# Altium footprint library UWRT Footprint Library.PcbLib: 258 footprints (part 14 of 17)
Each footprint in its own frame and in the unit in brackets; x right, y up, seen from the top. Pads: shape width x height; smd on the part's side, far side on the other; paste and mask are expansions set on the pad; w line width, h text height; cw(c..) or ccw(c..) is an arc to the next point about the centre after c.
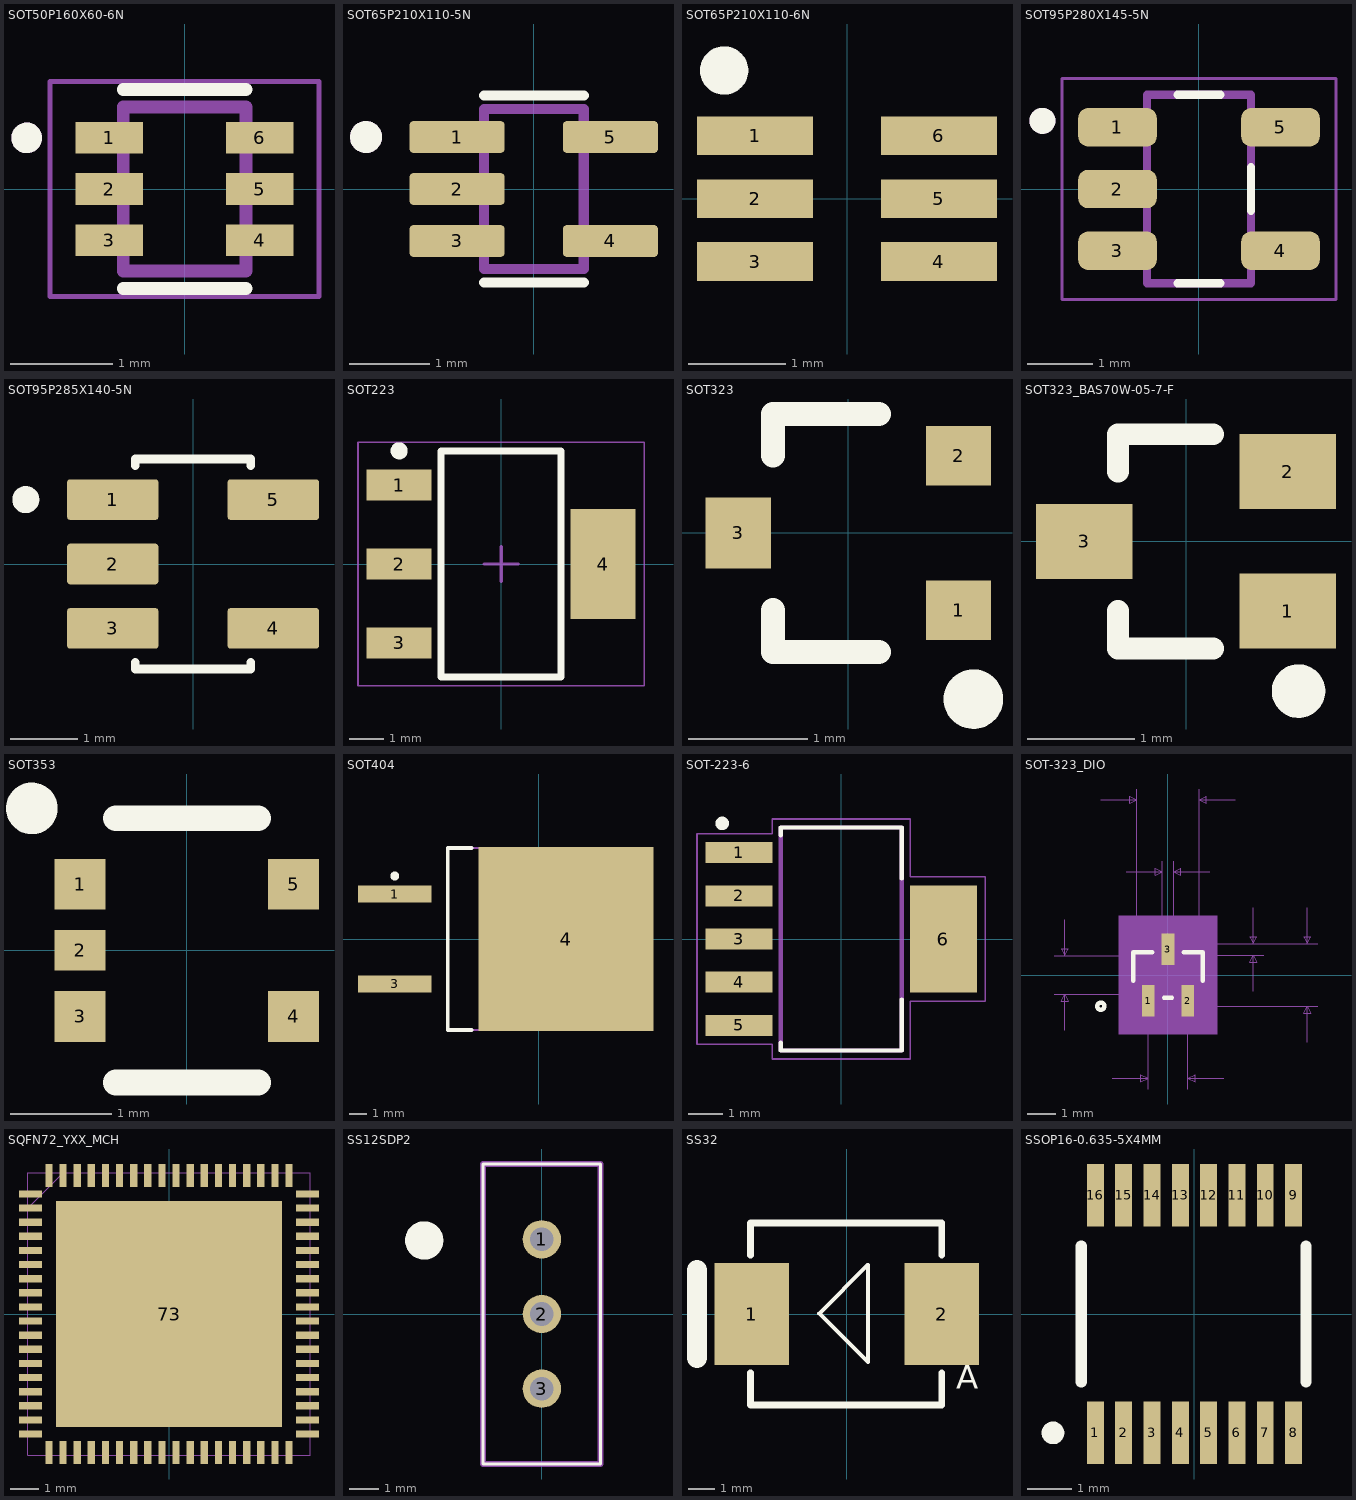
[diagram p13: the footprints below, top view; thin cyan lines are the x and y axes]

## SOT50P160X60-6N [mm]
pads (6):
  rect 0.66x0.31 smd: 1(-0.735,0.5) 2(-0.735,0) 3(-0.735,-0.5) 4(0.735,-0.5) 5(0.735,0) 6(0.735,0.5)
Top Overlay:
  circle w0.15: c-1.545,0.5 r0.075
  lines w0.127: -0.6,-0.975 0.6,-0.975 ; -0.6,0.975 0.6,0.975
Mechanical 4:
  circle w0.15: c-1.545,0.5 r0.075
  circle w0.15: c-1.545,0.5 r0.075
  lines w0.127: -0.6,-0.8 0.6,-0.8 ; -0.6,-0.8 -0.6,0.8 ; -0.6,-0.8 0.6,-0.8 ; -0.6,-0.8 -0.6,0.8 ; -0.6,0.8 0.6,0.8 ; -0.6,0.8 0.6,0.8 ; 0.6,-0.8 0.6,0.8 ; 0.6,-0.8 0.6,0.8
Mechanical 16:
  lines w0.05: -1.315,-1.05 1.315,-1.05 1.315,1.05 -1.315,1.05 -1.315,-1.05
3D body "DRL0006A.stp": height 0.6, standoff 0, extent -0.8,-0.8 0.8,0.8

## SOT65P210X110-5N [mm]
pads (5):
  rrect25% 1.19x0.4 smd: 1(-0.96,0.65) 2(-0.96,0) 3(-0.96,-0.65) 4(0.96,-0.65) 5(0.96,0.65)
Top Overlay:
  circle w0.2: c-2.1,0.65 r0.1
  lines w0.127: -0.625,-1.17 0.625,-1.17 ; -0.625,1.17 0.625,1.17
Mechanical 13:
  circle w0.2: c-2.1,0.65 r0.1
  lines w0.127: -0.625,-1 -0.625,1 0.625,1 0.625,-1 -0.625,-1
3D body "step_temp.STEP": height 1.1, standoff 0, extent -1.05,-1 1.05,1

## SOT65P210X110-6N [mm]
pads (6):
  rect 1.2x0.4 smd: 1(-0.95,0.65) 2(-0.95,0) 3(-0.95,-0.65) 4(0.95,-0.65) 5(0.95,0) 6(0.95,0.65)
Top Overlay:
  circle w0.25: c-1.27,1.325 r0.125
3D body "SN74LVC1T45QDCKRQ1.stp": height 1.1, standoff 0, extent -1.05,-1 1.05,1

## SOT95P280X145-5N [mm]
pads (5):
  rrect50% 1.21x0.59 smd: 1(-1.255,0.95) 2(-1.255,0) 3(-1.255,-0.95) 4(1.255,-0.95) 5(1.255,0.95)
Top Overlay:
  circle w0.2: c-2.41,1.05 r0.1
  lines w0.127: -0.33,-1.45 0.33,-1.45 ; -0.33,1.45 0.33,1.45 ; 0.8,-0.335 0.8,0.335
Mechanical 13:
  circle w0.2: c-2.41,1.05 r0.1
  lines w0.127: -0.8,-1.45 0.8,-1.45 0.8,1.45 -0.8,1.45 -0.8,-1.45
Mechanical 15:
  lines w0.05: -2.11,-1.7 -2.11,1.7 2.11,1.7 2.11,-1.7 -2.11,-1.7
3D body "TPS2065CDBVT.STEP": height 1.45, standoff 0, extent -1.4,-1.45 1.4,1.45

## SOT95P285X140-5N [mm] "AP2112K-3.3TRG1 LDO"
pads (5):
  rrect15% 1.35x0.6 smd: 1(-1.185,0.95) 2(-1.185,0) 3(-1.185,-0.95) 4(1.185,-0.95) 5(1.185,0.95)
Top Overlay:
  circle w0.2: c-2.469,0.95 r0.1
  lines w0.127: -0.85,-1.45 -0.85,-1.55 0.85,-1.55 0.85,-1.45 ; -0.85,1.45 -0.85,1.55 0.85,1.55 0.85,1.45
3D body "AP2112K-3.3TRG1--3DModel-STEP-56544.STEP": height 1.4, standoff 0, extent -1.4,-1.5 1.4,1.5

## SOT223 [mm] "SOT223, 4-Leads, Body 6.50x7.00mm (avg), Pitch 2.30mm, IPC Medium Density"
height 1.65
pads (4):
  rect 1.9x0.9 smd: 1(-2.975,2.3) 2(-2.975,0) 3(-2.975,-2.3)
  rect 1.9x3.2 smd: 4(2.975,0)
Top Overlay:
  circle w0.25: c-2.975,3.3 r0.125
  lines w0.2: -1.75,-3.3 -1.75,3.3 1.75,3.3 1.75,-3.3 -1.75,-3.3
Mechanical 13:
  lines w0.1: -1.775,-3.275 -1.775,3.275 1.775,3.275 1.775,-3.275 -1.775,-3.275
Mechanical 15:
  lines w0.05: -4.175,-3.55 -4.175,3.55 4.175,3.55 4.175,-3.55 -4.175,-3.55
  lines w0.1: -0.5,0 0.5,0 ; 0,-0.5 0,0.5
3D body "CircuitWorks-SOT-223.STEP": height 1.65, standoff -0.03, extent -3.48,-3.25 3.48,3.25

## SOT323 [mm]
pads (3):
  rect 0.55x0.5 smd: 1(0.925,-0.65) 2(0.925,0.65)
  rect 0.55x0.6 smd: 3(-0.925,0)
Top Overlay:
  circle w0.25: c1.05,-1.397 r0.125
  lines w0.203: -0.635,-0.65 -0.635,-1 0.254,-1 ; -0.635,0.65 -0.635,1 0.254,1
3D body "NX3008NBKW,115--3DModel-STEP-56544.STEP": height 1.11, standoff 0.01, extent -1.05,-1 1.05,1

## SOT323_BAS70W-05-7-F [mm]
pads (3):
  rect 0.9x0.7 smd: 1(0.95,-0.65) 2(0.95,0.65) 3(-0.95,0)
Top Overlay:
  circle w0.25: c1.05,-1.397 r0.125
  lines w0.203: -0.635,-0.65 -0.635,-1 0.254,-1 ; -0.635,0.65 -0.635,1 0.254,1
3D body "NX3008NBKW,115--3DModel-STEP-56544.STEP": height 1.11, standoff 0.01, extent -1.05,-1 1.05,1

## SOT353 [mm] "TSSOP5, SC-70-5"
pads (5):
  rect 0.5x0.5 smd: 1(-1.05,0.65) 3(-1.05,-0.65) 4(1.05,-0.65) 5(1.05,0.65)
  rect 0.5x0.4 smd: 2(-1.05,0)
Top Overlay:
  circle w0.254: c-1.524,1.397 r0.127
  lines w0.254: -0.699,-1.3 0.699,-1.3 ; -0.699,1.3 0.699,1.3
3D body "User Library-SOT353-1.step": height 1.1, standoff 0, extent -1.2,-1.1 1.2,1.1

## SOT404 [mm]
pads (3):
  rect 4.15x0.95 smd: 1(-8.155,2.54) 3(-8.155,-2.54)
  rect 9.9x10.4 smd: 4(1.545,0)
Top Overlay:
  circle w0.25: c-8.155,3.565 r0.125
  lines w0.2: -3.805,-5.15 -5.155,-5.15 -5.155,5.15 -3.805,5.15
Mechanical 13:
  lines w0.1: -5.155,-5.15 4.645,-5.15 4.645,5.15 -5.155,5.15 -5.155,-5.15
3D body: height 4.5, standoff 0, extent -5.155,-5.15 4.645,5.15

## SOT-223-6 [mm]
pads (6):
  rect 1.97x0.62 smd: 1(-3.005,2.54) 2(-3.005,1.27) 3(-3.005,0) 4(-3.005,-1.27) 5(-3.005,-2.54)
  rect 1.97x3.16 smd: 6(3.005,0)
Top Overlay:
  circle w0.2: c-3.5,3.4 r0.1
  lines w0.127: -1.78,-3.05 -1.78,-3.28 1.78,-3.28 1.78,-1.78 ; -1.78,3.05 -1.78,3.28 1.78,3.28 1.78,1.78
Mechanical 4:
  circle w0.2: c-3.5,2.54 r0.1
  circle w0.2: c-3.5,2.54 r0.1
  lines w0.127: -1.78,-3.28 1.78,-3.28 ; -1.78,-3.28 -1.78,3.28 ; -1.78,-3.28 1.78,-3.28 ; -1.78,-3.28 -1.78,3.28 ; -1.78,3.28 1.78,3.28 ; -1.78,3.28 1.78,3.28 ; 1.78,-3.28 1.78,3.28 ; 1.78,-3.28 1.78,3.28
Mechanical 16:
  lines w0.05: -4.24,-3.1 -4.24,3.1 -2.03,3.1 -2.03,3.53 2.03,3.53 2.03,1.83 4.24,1.83 4.24,-1.83 2.03,-1.83 2.03,-3.53 -2.03,-3.53 -2.03,-3.1 -4.24,-3.1
3D body "User Library-SOT-223-6.step": height 1.8, standoff 0, extent -3.63,-3.275 3.63,3.275

## SOT-323_DIO [mm]
pads (3):
  rect 0.451x1.111 smd paste+0 mask+0: 1(-0.7,-0.9) 2(0.7,-0.9) 3(0,0.9)
Top Overlay:
  circle w0.152: c-2.37,-1.1 r0.127
  lines w0.152: -1.227,-0.204 -1.227,0.802 -0.558,0.802 ; -0.142,-0.802 0.142,-0.802 ; 0.558,0.802 1.227,0.802 1.227,-0.204
Mechanical 5:
  region: -1.735,2.091 1.735,2.091 1.735,-2.091 -1.735,-2.091
Mechanical 7:
  lines w0.025: -4.021,-0.675 0,-0.675 ; -4.021,0.675 0,0.675 ; -3.64,-1.945 -3.64,-0.675 ; -3.64,1.945 -3.64,0.675 ; -2.37,6.18 -1.1,6.18 ; -1.97,-3.64 -0.7,-3.64 ; -1.47,3.64 -0.2,3.64 ; -1.1,0.675 -1.1,6.561 ; -0.7,-4.021 -0.7,-1.1 ; -0.2,1.1 -0.2,4.021 ; 0,-1.1 5.291,-1.1 ; 0,0.7 3.386,0.7 ; 0.2,1.1 0.2,4.021 ; 0.7,-4.021 0.7,-1.1 ; 1.1,0.675 1.1,6.561 ; 1.47,3.64 0.2,3.64 ; 1.97,-3.64 0.7,-3.64 ; 2.37,6.18 1.1,6.18 ; 3.005,-0.57 3.005,0.7 ; 3.005,2.37 3.005,1.1 ; 3.386,1.1 0,1.1 5.291,1.1 ; 4.91,-2.37 4.91,-1.1 ; 4.91,2.37 4.91,1.1 ; -3.64,-0.675 -3.513,-0.929 -3.767,-0.929 -3.64,-0.675 ; -3.64,0.675 -3.513,0.929 -3.767,0.929 -3.64,0.675 ; -1.1,6.18 -1.354,6.053 -1.354,6.307 -1.1,6.18 ; -0.7,-3.64 -0.954,-3.767 -0.954,-3.513 -0.7,-3.64 ; -0.2,3.64 -0.454,3.513 -0.454,3.767 -0.2,3.64 ; 0.2,3.64 0.454,3.513 0.454,3.767 0.2,3.64 ; 0.7,-3.64 0.954,-3.767 0.954,-3.513 0.7,-3.64 ; 1.1,6.18 1.354,6.053 1.354,6.307 1.1,6.18 ; 3.005,0.7 3.132,0.446 2.878,0.446 3.005,0.7 ; 3.005,1.1 3.132,1.354 2.878,1.354 3.005,1.1 ; 4.91,-1.1 5.037,-1.354 4.783,-1.354 4.91,-1.1 ; 4.91,1.1 5.037,1.354 4.783,1.354 4.91,1.1
  text "0.053in/1.35mm" at -8.593,-0.318 h0.64
  text "0.087in/2.2mm" at -2.064,6.688 h0.64
  text "0.016in/0.4mm" at -2.064,4.148 h0.64
  text "0.055in/1.4mm" at -2.064,-4.783 h0.64
  text "0.016in/0.4mm" at 3.513,0.583 h0.64
  text "0.087in/2.2mm" at 5.418,-0.318 h0.64
  text "Alt 2 Padstyle: OX90Y60D30P" at -8.572,-13.521 h1.27
  text "Alt 1 Padstyle: OX60Y90D30P" at -8.572,-11.616 h1.27
  text "Bottom Padstyle: RX17p75Y43p75D0T" at -10.477,-9.711 h1.27
  text "Top Padstyle: RX17p75Y43p75D0T" at -9.525,-7.806 h1.27
Mechanical 13:
  circle w0: c-0.846,-0.421 r0.127
  lines w0.025: -1.1,-0.675 -1.1,0.675 1.1,0.675 1.1,-0.675 -1.1,-0.675 ; -0.9,-1.1 -0.5,-1.1 -0.5,-0.675 -0.9,-0.675 -0.9,-1.1 ; -0.2,0.675 -0.2,1.1 0.2,1.1 0.2,0.675 -0.2,0.675 ; 0.5,-1.1 0.9,-1.1 0.9,-0.675 0.5,-0.675 0.5,-1.1
Mechanical 15:
  region: 1.1,-0.675 -1.1,-0.675 -1.1,0.675 1.1,0.675
  region: -1.354,-0.929 -1.354,0.929 -0.479,0.929 -0.479,1.71 0.479,1.71 0.479,0.929 1.354,0.929 1.354,-0.929 1.179,-0.929 1.179,-1.71 -1.179,-1.71 -1.179,-0.929
  lines w0.152: -1.354,-0.929 -1.179,-0.929 -1.179,-1.71 1.179,-1.71 1.179,-0.929 1.354,-0.929 1.354,0.929 0.479,0.929 0.479,1.71 -0.479,1.71 -0.479,0.929 -1.354,0.929 -1.354,-0.929
3D body: height 0.25, standoff 0, extent 0,0 0.254,0.254
3D body "SOT-323_DIO.step": height 1, standoff 0, extent -1.1,-1.1 1.1,1.1

## SQFN72_YXX_MCH [mil]
pads (73):
  rect 32x10 smd paste+0 mask+0: 1(-193,167.32) 2(-193,147.64) 3(-193,127.95) 4(-193,108.27) 5(-193,88.58) 6(-193,68.9) 7(-193,49.21) 8(-193,29.53) 9(-193,9.84) 10(-193,-9.84) 11(-193,-29.53) 12(-193,-49.21) 13(-193,-68.9) 14(-193,-88.58) 15(-193,-108.27) 16(-193,-127.95) 17(-193,-147.64) 18(-193,-167.32) 37(193,-167.32) 38(193,-147.64) 39(193,-127.95) 40(193,-108.27) 41(193,-88.58) 42(193,-68.9) 43(193,-49.21) 44(193,-29.53) 45(193,-9.84) 46(193,9.84) 47(193,29.53) 48(193,49.21) 49(193,68.9) 50(193,88.58) 51(193,108.27) 52(193,127.95) 53(193,147.64) 54(193,167.32)
  rect 10x32 smd paste+0 mask+0: 19(-167.32,-193) 20(-147.64,-193) 21(-127.95,-193) 22(-108.27,-193) 23(-88.58,-193) 24(-68.9,-193) 25(-49.21,-193) 26(-29.53,-193) 27(-9.84,-193) 28(9.84,-193) 29(29.53,-193) 30(49.21,-193) 31(68.9,-193) 32(88.58,-193) 33(108.27,-193) 34(127.95,-193) 35(147.64,-193) 36(167.32,-193) 55(167.32,193) 56(147.64,193) 57(127.95,193) 58(108.27,193) 59(88.58,193) 60(68.9,193) 61(49.21,193) 62(29.53,193) 63(9.84,193) 64(-9.84,193) 65(-29.53,193) 66(-49.21,193) 67(-68.9,193) 68(-88.58,193) 69(-108.27,193) 70(-127.95,193) 71(-147.64,193) 72(-167.32,193)
  rect 315x315 smd paste-157 mask+0: 73(0,0)
Top Paste:
  region: -108.94,153.56 -153.56,153.56 -153.56,108.94 -108.94,108.94
  region: -108.94,101.06 -153.56,101.06 -153.56,56.44 -108.94,56.44
  region: -108.94,48.56 -153.56,48.56 -153.56,3.94 -108.94,3.94
  region: -108.94,-3.94 -153.56,-3.94 -153.56,-48.56 -108.94,-48.56
  region: -108.94,-56.44 -153.56,-56.44 -153.56,-101.06 -108.94,-101.06
  region: -108.94,-108.94 -153.56,-108.94 -153.56,-153.56 -108.94,-153.56
  region: -56.44,153.56 -101.06,153.56 -101.06,108.94 -56.44,108.94
  region: -56.44,101.06 -101.06,101.06 -101.06,56.44 -56.44,56.44
  region: -56.44,48.56 -101.06,48.56 -101.06,3.94 -56.44,3.94
  region: -56.44,-3.94 -101.06,-3.94 -101.06,-48.56 -56.44,-48.56
  region: -56.44,-56.44 -101.06,-56.44 -101.06,-101.06 -56.44,-101.06
  region: -56.44,-108.94 -101.06,-108.94 -101.06,-153.56 -56.44,-153.56
  region: -3.94,153.56 -48.56,153.56 -48.56,108.94 -3.94,108.94
  region: -3.94,101.06 -48.56,101.06 -48.56,56.44 -3.94,56.44
  region: -3.94,48.56 -48.56,48.56 -48.56,3.94 -3.94,3.94
  region: -3.94,-3.94 -48.56,-3.94 -48.56,-48.56 -3.94,-48.56
  region: -3.94,-56.44 -48.56,-56.44 -48.56,-101.06 -3.94,-101.06
  region: -3.94,-108.94 -48.56,-108.94 -48.56,-153.56 -3.94,-153.56
  region: 48.56,153.56 3.94,153.56 3.94,108.94 48.56,108.94
  region: 48.56,101.06 3.94,101.06 3.94,56.44 48.56,56.44
  region: 48.56,48.56 3.94,48.56 3.94,3.94 48.56,3.94
  region: 48.56,-3.94 3.94,-3.94 3.94,-48.56 48.56,-48.56
  region: 48.56,-56.44 3.94,-56.44 3.94,-101.06 48.56,-101.06
  region: 48.56,-108.94 3.94,-108.94 3.94,-153.56 48.56,-153.56
  region: 101.06,153.56 56.44,153.56 56.44,108.94 101.06,108.94
  region: 101.06,101.06 56.44,101.06 56.44,56.44 101.06,56.44
  region: 101.06,48.56 56.44,48.56 56.44,3.94 101.06,3.94
  region: 101.06,-3.94 56.44,-3.94 56.44,-48.56 101.06,-48.56
  region: 101.06,-56.44 56.44,-56.44 56.44,-101.06 101.06,-101.06
  region: 101.06,-108.94 56.44,-108.94 56.44,-153.56 101.06,-153.56
  region: 153.56,153.56 108.94,153.56 108.94,108.94 153.56,108.94
  region: 153.56,101.06 108.94,101.06 108.94,56.44 153.56,56.44
  region: 153.56,48.56 108.94,48.56 108.94,3.94 153.56,3.94
  region: 153.56,-3.94 108.94,-3.94 108.94,-48.56 153.56,-48.56
  region: 153.56,-56.44 108.94,-56.44 108.94,-101.06 153.56,-101.06
  region: 153.56,-108.94 108.94,-108.94 108.94,-153.56 153.56,-153.56
Mechanical 13:
  lines w1: -197,147 -147,197 ; -197,-197 197,-197 197,197 -197,197 -197,-197 ; -197,-173.32 -197,-161.32 -197,-173.32 ; -197,-153.64 -197,-141.64 -197,-153.64 ; -197,-133.95 -197,-121.95 -197,-133.95 ; -197,-114.27 -197,-102.27 -197,-114.27 ; -197,-94.58 -197,-82.58 -197,-94.58 ; -197,-74.9 -197,-62.9 -197,-74.9 ; -197,-55.21 -197,-43.21 -197,-55.21 ; -197,-35.53 -197,-23.53 -197,-35.53 ; -197,-15.84 -197,-3.84 -197,-15.84 ; -197,3.84 -197,15.84 -197,3.84 ; -197,23.53 -197,35.53 -197,23.53 ; -197,43.21 -197,55.21 -197,43.21 ; -197,62.9 -197,74.9 -197,62.9 ; -197,82.58 -197,94.58 -197,82.58 ; -197,102.27 -197,114.27 -197,102.27 ; -197,121.95 -197,133.95 -197,121.95 ; -197,141.64 -197,153.64 -197,141.64 ; -197,161.32 -197,173.32 -197,161.32 ; -173.32,-197 -161.32,-197 -173.32,-197 ; -173.32,197 -161.32,197 -173.32,197 ; -153.64,-197 -141.64,-197 -153.64,-197 ; -153.64,197 -141.64,197 -153.64,197 ; -133.95,-197 -121.95,-197 -133.95,-197 ; -133.95,197 -121.95,197 -133.95,197 ; -114.27,-197 -102.27,-197 -114.27,-197 ; -114.27,197 -102.27,197 -114.27,197 ; -94.58,-197 -82.58,-197 -94.58,-197 ; -94.58,197 -82.58,197 -94.58,197 ; -74.9,-197 -62.9,-197 -74.9,-197 ; -74.9,197 -62.9,197 -74.9,197 ; -55.21,-197 -43.21,-197 -55.21,-197 ; -55.21,197 -43.21,197 -55.21,197 ; -35.53,-197 -23.53,-197 -35.53,-197 ; -35.53,197 -23.53,197 -35.53,197 ; -15.84,-197 -3.84,-197 -15.84,-197 ; -15.84,197 -3.84,197 -15.84,197 ; 3.84,-197 15.84,-197 3.84,-197 ; 3.84,197 15.84,197 3.84,197 ; 23.53,-197 35.53,-197 23.53,-197 ; 23.53,197 35.53,197 23.53,197 ; 43.21,-197 55.21,-197 43.21,-197 ; 43.21,197 55.21,197 43.21,197 ; 62.9,-197 74.9,-197 62.9,-197 ; 62.9,197 74.9,197 62.9,197 ; 82.58,-197 94.58,-197 82.58,-197 ; 82.58,197 94.58,197 82.58,197 ; 102.27,-197 114.27,-197 102.27,-197 ; 102.27,197 114.27,197 102.27,197 ; 121.95,-197 133.95,-197 121.95,-197 ; 121.95,197 133.95,197 121.95,197 ; 141.64,-197 153.64,-197 141.64,-197 ; 141.64,197 153.64,197 141.64,197 ; 161.32,-197 173.32,-197 161.32,-197 ; 161.32,197 173.32,197 161.32,197 ; 197,-173.32 197,-161.32 197,-173.32 ; 197,-153.64 197,-141.64 197,-153.64 ; 197,-133.95 197,-121.95 197,-133.95 ; 197,-114.27 197,-102.27 197,-114.27 ; 197,-94.58 197,-82.58 197,-94.58 ; 197,-74.9 197,-62.9 197,-74.9 ; 197,-55.21 197,-43.21 197,-55.21 ; 197,-35.53 197,-23.53 197,-35.53 ; 197,-15.84 197,-3.84 197,-15.84 ; 197,3.84 197,15.84 197,3.84 ; 197,23.53 197,35.53 197,23.53 ; 197,43.21 197,55.21 197,43.21 ; 197,62.9 197,74.9 197,62.9 ; 197,82.58 197,94.58 197,82.58 ; 197,102.27 197,114.27 197,102.27 ; 197,121.95 197,133.95 197,121.95 ; 197,141.64 197,153.64 197,141.64 ; 197,161.32 197,173.32 197,161.32
  text "*" at -189.5,152.17 h50
3D body: height 10, standoff 0, extent 0,0 10,10

## SS12SDP2 [mm]
pads (3):
  round 1.3 hole 0.8: 1(0,2.54) 2(0,0) 3(0,-2.54)
Top Overlay:
  circle w0.7: c-4,2.5 r0.3
  lines w0.1: -2,-5.1 -2,5.1 2,5.1 2,-5.1 -2,-5.1
Mechanical 13:
  lines w0.2: -2,-5.1 -2,5.1 2,5.1 2,-5.1 -2,-5.1
3D body "Switch_1.stp": height 6.35, standoff -3.15, extent -1.956,-5.105 2.032,5.105

## SS32 [mm] "Schottky Diode"
pads (2):
  rect 2.794x3.81 smd: 1(-3.555,0) 2(3.555,0)
Top Overlay:
  lines w0.154: 0.783,-1.783 -1.025,0.025 0.783,1.833 ; 0.8,-1.8 0.8,1.83
  lines w0.254: -3.6,-2.2 -3.6,-3.4 3.555,-3.4 3.555,-2.2 ; -3.6,2.2 -3.6,3.4 3.555,3.4 3.555,2.2
  lines w0.754: -5.6,-1.65 -5.6,1.65
  text "A" at 4.1,-3.1 h1.52
Mechanical 1:
  region: -5.25,3
  region: -5.25,-1.65
3D body: height 2.41, standoff 0, extent -3.6,-3.4 3.555,3.4
3D body: height 0.25, standoff 0, extent -3.75,3.15 -3.75,3.15

## SSOP16-0.635-5X4MM [mil]
pads (16):
  rect 15x55 smd: 1(-87.5,-105) 2(-62.5,-105) 3(-37.5,-105) 4(-12.5,-105) 5(12.5,-105) 6(37.5,-105) 7(62.5,-105) 8(87.5,-105) 9(87.5,105) 10(62.5,105) 11(37.5,105) 12(12.5,105) 13(-12.5,105) 14(-37.5,105) 15(-62.5,105) 16(-87.5,105)
Top Overlay:
  circle w10: c-125,-105 r5
  lines w10: -100,-60 -100,60 ; 98.5,-60 98.5,60
3D body "SOIC_30XS-R_FTD.step": height 69.09, standoff 0, extent -98.51,-122 98.5,122.01